# Altium footprint library SCT8-Board.PcbLib: 132 footprints (part 6 of 9)
Each footprint in its own frame and in the unit in brackets; x right, y up, seen from the top. Pads: shape width x height; smd on the part's side, far side on the other; paste and mask are expansions set on the pad; w line width, h text height; cw(c..) or ccw(c..) is an arc to the next point about the centre after c.
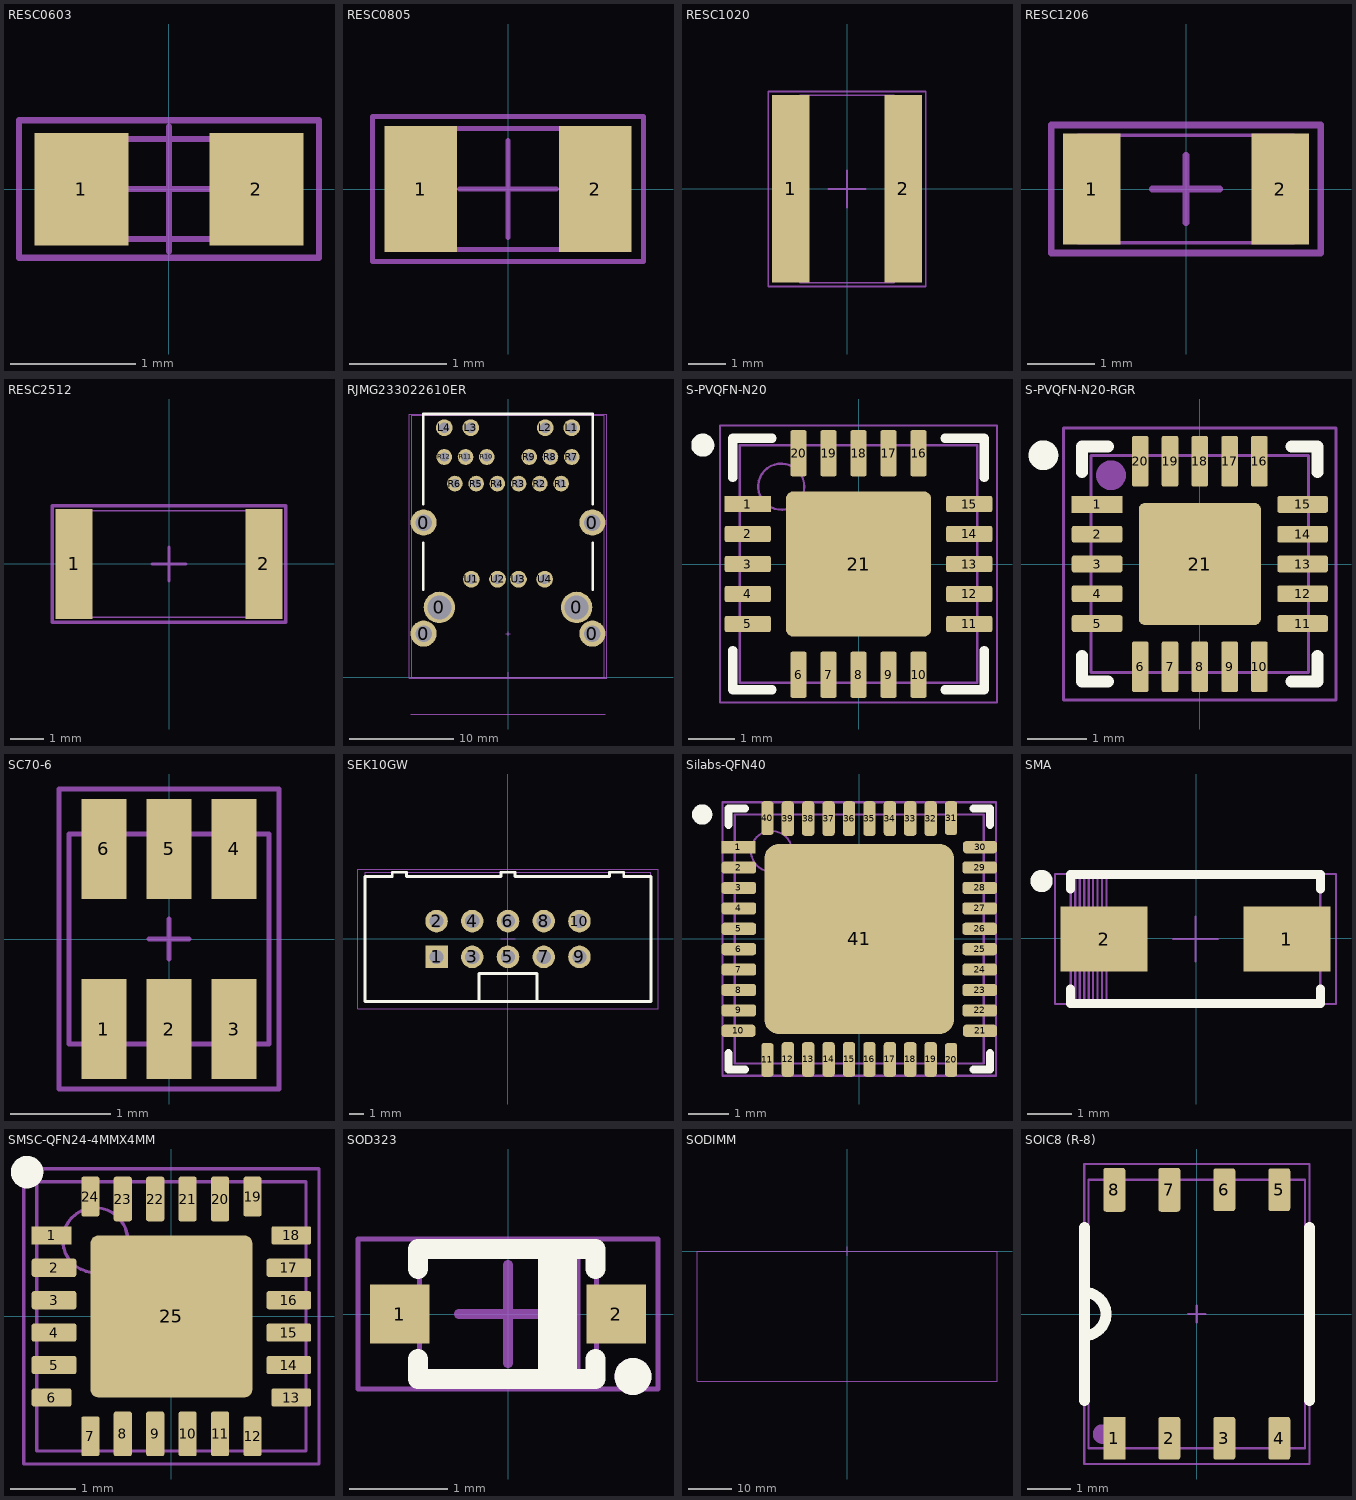
[diagram p5: the footprints below, top view; thin cyan lines are the x and y axes]

## RESC0603 [mm] "Chip Resistor, Body 1.6x0.8mm (LxW typ) [0603], IPC High Density"
height 0.55
pads (2):
  rect 0.75x0.9 smd: 1(-0.7,0) 2(0.7,0)
Top Courtyard:
  lines w0.05: -1.2,-0.55 1.2,-0.55 1.2,0.55 -1.2,0.55 -1.2,-0.55
Top Designator:
  text ".Designator" at -1.126,-0.113 h0.5
Top Component Center:
  lines w0.05: -0.5,0 0.5,0 ; 0,-0.5 0,0.5
Top Component Outline:
  lines w0.05: -0.8,-0.4 -0.8,0.4 0.8,0.4 0.8,-0.4 -0.8,-0.4
3D body "R0603.STEP": height 0.45, standoff 0, extent -0.8,-0.4 0.8,0.4

## RESC0805 [mm] "Chip Resistor, Body 2.0x1.3mm (LxW typ) [0805], IPC High Density"
height 0.6
pads (2):
  rect 0.75x1.3 smd: 1(-0.9,0) 2(0.9,0)
Top Courtyard:
  lines w0.05: -1.4,-0.75 1.4,-0.75 1.4,0.75 -1.4,0.75 -1.4,-0.75
Top Designator:
  text ".Designator" at -1.349,-0.135 h0.6
Top Component Center:
  lines w0.05: -0.5,0 0.5,0 ; 0,-0.5 0,0.5
Top Component Outline:
  lines w0.05: -1,-0.625 -1,0.625 1,0.625 1,-0.625 -1,-0.625
3D body "R0805.STEP": height 0.6, standoff 0, extent -1,-0.625 1,0.625

## RESC1020 [mm] "Chip Resistor, Body 2.5x5.0mm (LxW typ) [1020]"
height 0.65
pads (2):
  rect 1x5 smd: 1(-1.5,0) 2(1.5,0)
Top Courtyard:
  lines w0.05: -2.1,-2.6 2.1,-2.6 2.1,2.6 -2.1,2.6 -2.1,-2.6
Top Designator:
  text ".Designator" at 0.135,-1.349 h0.6
Top Component Center:
  lines w0.05: -0.5,0 0.5,0 ; 0,-0.5 0,0.5
Top Component Outline:
  lines w0.05: -1.25,-2.5 -1.25,2.5 1.25,2.5 1.25,-2.5 -1.25,-2.5
3D body "R1020.STEP": height 0.63, standoff -0.02, extent -1.25,-2.5 1.25,2.5

## RESC1206 [mm] "Chip Resistor, Body 3.2x1.6mm (LxW typ) [1206], IPC High Density"
height 0.65
pads (2):
  rect 0.85x1.65 smd: 1(-1.4,0) 2(1.4,0)
Top Courtyard:
  lines w0.1: -2,-0.95 2,-0.95 2,0.95 -2,0.95 -2,-0.95
Top Designator:
  text ".Designator" at -1.912,-0.192 h0.85
Top Component Center:
  lines w0.1: -0.5,0 0.5,0 ; 0,-0.5 0,0.5
Top Component Outline:
  lines w0.05: -1.6,-0.8 1.6,-0.8 1.6,0.8 -1.6,0.8 -1.6,-0.8
3D body "R1206.STEP": height 0.6, standoff 0, extent -1.6,-0.8 1.6,0.8

## RESC2512 [mm] "Chip Resistor, Body 6.3x3.2mm (LxW typ) [2512], IPC High Density"
height 0.65
pads (2):
  rect 1.1x3.3 smd: 1(-2.85,0) 2(2.85,0)
Top Courtyard:
  lines w0.1: -3.5,-1.75 3.5,-1.75 3.5,1.75 -3.5,1.75 -3.5,-1.75
Top Designator:
  text ".Designator" at -3.378,-0.339 h1.5
Top Component Center:
  lines w0.1: -0.5,0 0.5,0 ; 0,-0.5 0,0.5
Top Component Outline:
  lines w0.05: -3.2,-1.6 -3.2,1.6 3.2,1.6 3.2,-1.6 -3.2,-1.6
3D body "R2512.STEP": height 0.6, standoff 0, extent -3.2,-1.6 3.2,1.6

## RJMG233022610ER [mm] "RJ45 + USB"
pads (26):
  round 2.5 hole 1.57: 0(-8.065,4.18) 0(-8.065,14.8) 0(8.065,4.18) 0(8.065,14.8)
  round 3 hole 2.3: 0(-6.565,6.69) 0(6.565,6.69)
  round 1.6 hole 0.97: L1(6.09,23.87) L2(3.555,23.87) L3(-3.555,23.87) L4(-6.09,23.87) U1(-3.5,9.39) U2(-1,9.39) U3(1,9.39) U4(3.5,9.39)
  round 1.5 hole 0.89: R1(5.075,18.53) R2(3.045,18.53) R3(1.015,18.53) R4(-1.015,18.53) R5(-3.045,18.53) R6(-5.075,18.53) R7(6.09,21.07) R8(4.06,21.07) R9(2.03,21.07) R10(-2.03,21.07) R11(-4.06,21.07) R12(-6.09,21.07)
Top Overlay:
  lines w0.254: -8.1,8.38 -8.1,12.88 ; -8.1,16.58 -8.1,25.18 ; -8.065,25.18 8.1,25.18 8.1,16.58 ; 8.1,8.38 8.1,12.88
Top Solder:
  region: 8.222,5.42 6.893,4.615 6.482,5.192 7.877,5.963
  region: -8.222,5.42 -6.893,4.615 -6.482,5.192 -7.877,5.963
Bottom Solder:
  region: -8.222,5.42 -6.893,4.615 -6.482,5.192 -7.877,5.963
  region: 8.222,5.42 6.893,4.615 6.482,5.192 7.877,5.963
Top Courtyard:
  lines w0.05: -9.45,-0.1 -9.45,25.15 9.45,25.15 9.45,-0.1 -9.45,-0.1
Top Designator:
  text ".Designator" at -10.297,13.984 h2
Top 3D Body:
  lines w0.05: -9.209,0 -9.209,25.07 9.209,25.07 9.209,0 0,0 -9.209,0
Top Component Center:
  lines w0.1: -9.3,-3.5 9.3,-3.5 ; -9.3,0 9.3,0 ; -0.2,4.18 0.2,4.18 ; 0,0 0,0.49 ; 0,3.98 0,4.38
Top Component Outline:
  lines w0.05: -9.45,-0.1 9.45,-0.1 9.45,25.15 -9.45,25.15 -9.45,-0.1
3D body "RJMG233022610ER.STEP": height 23, standoff -3.43, extent -9.209,-45.589 9.209,25.07

## S-PVQFN-N20 [mm] "(RGW) QFN 5mmx5mm, RM 0.65mm"
height 1
pads (21):
  rect 1x0.35 smd: 1(-2.4,1.3)
  rrect25% 1x0.35 smd: 2(-2.4,0.65) 3(-2.4,0) 4(-2.4,-0.65) 5(-2.4,-1.3) 11(2.4,-1.3) 12(2.4,-0.65) 13(2.4,0) 14(2.4,0.65) 15(2.4,1.3)
  rrect25% 0.35x1 smd: 6(-1.3,-2.4) 7(-0.65,-2.4) 8(0,-2.4) 9(0.65,-2.4) 10(1.3,-2.4) 16(1.3,2.4) 17(0.65,2.4) 18(0,2.4) 19(-0.65,2.4) 20(-1.3,2.4)
  rrect10% 3.15x3.15 smd: 21(0,0)
Top Overlay:
  circle w0.25: c-3.375,2.575 r0.125
  lines w0.2: -2.725,-1.875 -2.725,-2.725 -1.875,-2.725 ; -2.725,1.875 -2.725,2.725 -1.875,2.725 ; 1.875,-2.725 2.725,-2.725 2.725,-1.875 ; 1.875,2.725 2.725,2.725 2.725,1.875
Top Courtyard:
  lines w0.05: -3,-3 -3,3 3,3 3,-3 -3,-3
Top Designator:
  text ".Designator" at -1.912,-0.192 h0.85
Top Component Center:
  lines w0.1: -0.5,0 0.5,0 ; 0,-0.5 0,0.5
Top Component Outline:
  circle w0.05: c-1.675,1.675 r0.5
  lines w0.05: -2.575,-2.575 -2.575,2.575 2.575,2.575 2.575,-2.575 -2.575,-2.575
3D body: height 1, standoff 0, extent -2.575,-2.575 2.575,2.575

## S-PVQFN-N20-RGR [mm] "QFN, 20-Leads, Body 3.50x3.50mm, Pitch 0.50mm, Thermal Pad 2.05x2.05mm, IPC High Density"
height 1
pads (21):
  rect 0.85x0.28 smd: 1(-1.725,1)
  rrect25% 0.85x0.28 smd: 2(-1.725,0.5) 3(-1.725,0) 4(-1.725,-0.5) 5(-1.725,-1) 11(1.725,-1) 12(1.725,-0.5) 13(1.725,0) 14(1.725,0.5) 15(1.725,1)
  rrect25% 0.28x0.85 smd: 6(-1,-1.725) 7(-0.5,-1.725) 8(0,-1.725) 9(0.5,-1.725) 10(1,-1.725) 16(1,1.725) 17(0.5,1.725) 18(0,1.725) 19(-0.5,1.725) 20(-1,1.725)
  rrect10% 2.05x2.05 smd: 21(0,0)
Top Overlay:
  circle w0.25: c-2.625,1.825 r0.125
  lines w0.2: -1.975,-1.54 -1.975,-1.975 -1.54,-1.975 ; -1.975,1.54 -1.975,1.975 -1.54,1.975 ; 1.54,-1.975 1.975,-1.975 1.975,-1.54 ; 1.54,1.975 1.975,1.975 1.975,1.54
Top Courtyard:
  lines w0.05: -2.286,-2.286 -2.286,2.286 2.286,2.286 2.286,-2.286 -2.286,-2.286
Top Designator:
  text ".Designator" at -1.689,-0.17 h0.75
Top Component Center:
  lines w0.06: -0.5,0 0.5,0 ; 0,-0.5 0,0.5
Top Component Outline:
  circle w0.3: c-1.49,1.49 r0.1
  lines w0.05: -1.825,-1.825 1.825,-1.825 1.825,1.825 -1.825,1.825 -1.825,-1.825
3D body: height 1, standoff 0, extent -1.825,-1.825 1.825,1.825

## SC70-6 [mm]
pads (6):
  rect 0.45x1 smd paste+0 mask+0.05: 1(-0.65,-0.9) 2(0,-0.9) 3(0.65,-0.9) 4(0.65,0.9) 5(0,0.9) 6(-0.65,0.9)
Top Overlay:
  text "." at -0.65,-1.784 h1
Top Courtyard:
  lines w0.05: -1.1,-1.5 -1.1,1.5 1.1,1.5 1.1,-1.5 -1.1,-1.5
Top Designator:
  text ".Designator" at 0.102,-1.015 h0.45
Top Component Center:
  lines w0.05: -0.2,0 0.2,0 ; 0,-0.2 0,0.2
Top Component Outline:
  lines w0.05: -1,-1.05 -1,1.05 1,1.05 1,-1.05 -1,-1.05
3D body "SC70-6.STEP": height 0.95, standoff 0, extent -1,-1.05 1,1.05

## SEK10GW [mm]
height 9.45
pads (10):
  rect 1.6x1.6 hole 1: 1(-5.08,-1.27)
  round 1.6 hole 1: 2(-5.08,1.27) 3(-2.54,-1.27) 4(-2.54,1.27) 5(0,-1.27) 6(0,1.27) 7(2.54,-1.27) 8(2.54,1.27) 9(5.08,-1.27) 10(5.08,1.27)
Top Overlay:
  lines w0.2: -2.05,-4.45 -2.05,-2.45 2.05,-2.45 2.05,-4.45 ; 1.91,-4.45 10.16,-4.45 ; 2.81,-4.45 4.81,-4.45 ; 10.16,-4.45 10.16,4.45 8.22,4.45 8.22,4.75 7.22,4.75 7.22,4.45 0.5,4.45 0.5,4.75 -0.5,4.75 -0.5,4.45 -7.22,4.45 -7.22,4.75 -8.22,4.75 -8.22,4.45 -10.16,4.45 -10.16,-4.45 10.16,-4.45
Top Courtyard:
  lines w0.05: -10.66,-4.95 -10.66,4.95 10.66,4.95 10.66,-4.95 -10.66,-4.95
Top Designator:
  text ".Designator" at -1.912,-0.192 h0.85
Top 3D Body:
  lines w0.05: -5.395,-1.585 -4.765,-1.585 ; -5.395,-1.585 -4.765,-1.585 ; -5.395,-1.585 -5.395,-0.955 ; -5.395,-1.585 -5.395,-0.955 ; -5.395,-0.955 -4.765,-0.955 ; -5.395,-0.955 -4.765,-0.955 ; -5.395,0.955 -4.765,0.955 ; -5.395,0.955 -4.765,0.955 ; -5.395,0.955 -5.395,1.585 ; -5.395,0.955 -5.395,1.585 ; -5.395,1.585 -4.765,1.585 ; -5.395,1.585 -4.765,1.585 ; -4.765,-1.585 -4.765,-0.955 ; -4.765,-1.585 -4.765,-0.955 ; -4.765,0.955 -4.765,1.585 ; -4.765,0.955 -4.765,1.585 ; -2.855,-1.585 -2.855,-0.955 ; -2.855,-1.585 -2.855,-0.955 ; -2.855,-1.585 -2.225,-1.585 ; -2.855,-1.585 -2.225,-1.585 ; -2.855,-0.955 -2.225,-0.955 ; -2.855,-0.955 -2.225,-0.955 ; -2.855,0.955 -2.855,1.585 ; -2.855,0.955 -2.855,1.585 ; -2.855,0.955 -2.225,0.955 ; -2.855,0.955 -2.225,0.955 ; -2.855,1.585 -2.225,1.585 ; -2.855,1.585 -2.225,1.585 ; -2.225,-1.585 -2.225,-0.955 ; -2.225,-1.585 -2.225,-0.955 ; -2.225,0.955 -2.225,1.585 ; -2.225,0.955 -2.225,1.585 ; -0.315,-1.585 -0.315,-0.955 ; -0.315,-1.585 -0.315,-0.955 ; -0.315,-1.585 0.315,-1.585 ; -0.315,-1.585 0.315,-1.585 ; -0.315,-0.955 0.315,-0.955 ; -0.315,-0.955 0.315,-0.955 ; -0.315,0.955 -0.315,1.585 ; -0.315,0.955 -0.315,1.585 ; -0.315,0.955 0.315,0.955 ; -0.315,0.955 0.315,0.955 ; -0.315,1.585 0.315,1.585 ; -0.315,1.585 0.315,1.585 ; 0.315,-1.585 0.315,-0.955 ; 0.315,-1.585 0.315,-0.955 ; 0.315,0.955 0.315,1.585 ; 0.315,0.955 0.315,1.585 ; 2.225,-1.585 2.855,-1.585 ; 2.225,-1.585 2.855,-1.585 ; 2.225,-1.585 2.225,-0.955 ; 2.225,-1.585 2.225,-0.955 ; 2.225,-0.955 2.855,-0.955 ; 2.225,-0.955 2.855,-0.955 ; 2.225,0.955 2.855,0.955 ; 2.225,0.955 2.855,0.955 ; 2.225,0.955 2.225,1.585 ; 2.225,0.955 2.225,1.585 ; 2.225,1.585 2.855,1.585 ; 2.225,1.585 2.855,1.585 ; 2.855,-1.585 2.855,-0.955 ; 2.855,-1.585 2.855,-0.955 ; 2.855,0.955 2.855,1.585 ; 2.855,0.955 2.855,1.585 ; 4.765,-1.585 4.765,-0.955 ; 4.765,-1.585 4.765,-0.955 ; 4.765,-1.585 5.395,-1.585 ; 4.765,-1.585 5.395,-1.585 ; 4.765,-0.955 5.395,-0.955 ; 4.765,-0.955 5.395,-0.955 ; 4.765,0.955 4.765,1.585 ; 4.765,0.955 4.765,1.585 ; 4.765,0.955 5.395,0.955 ; 4.765,0.955 5.395,0.955 ; 4.765,1.585 5.395,1.585 ; 4.765,1.585 5.395,1.585 ; 5.395,-1.585 5.395,-0.955 ; 5.395,-1.585 5.395,-0.955 ; 5.395,0.955 5.395,1.585 ; 5.395,0.955 5.395,1.585
Top Component Center:
  lines w0.06: -0.5,0 0.5,0 ; 0,-0.5 0,0.5
Top Component Outline:
  lines w0.05: -10.16,-4.45 10.16,-4.45 10.16,4.75 -10.16,4.75 -10.16,-4.45
3D body "09185106324.STEP": height 9.5, standoff -2.85, extent -10.15,-4.45 10.15,4.75

## Silabs-QFN40 [mm] "QFN, 40-Leads, Body 6.00x6.00mm, Pitch 0.50mm, Thermal Pad 4.65x4.65mm, IPC High Density"
height 1.1
pads (41):
  rect 0.83x0.3 smd paste+0 mask+0.05: 1(-2.96,2.25)
  rrect50% 0.85x0.3 smd paste+0 mask+0.05: 2(-2.95,1.75) 3(-2.95,1.25) 4(-2.95,0.75) 5(-2.95,0.25) 6(-2.95,-0.25) 7(-2.95,-0.75) 8(-2.95,-1.25) 9(-2.95,-1.75) 22(2.95,-1.75) 23(2.95,-1.25) 24(2.95,-0.75) 25(2.95,-0.25) 26(2.95,0.25) 27(2.95,0.75) 28(2.95,1.25) 29(2.95,1.75)
  rrect50% 0.83x0.3 smd paste+0 mask+0.05: 10(-2.96,-2.25) 21(2.96,-2.25) 30(2.96,2.25)
  rrect50% 0.3x0.83 smd paste+0 mask+0.05: 11(-2.25,-2.96) 20(2.25,-2.96) 31(2.25,2.96) 40(-2.25,2.96)
  rrect50% 0.3x0.85 smd paste+0 mask+0.05: 12(-1.75,-2.95) 13(-1.25,-2.95) 14(-0.75,-2.95) 15(-0.25,-2.95) 16(0.25,-2.95) 17(0.75,-2.95) 18(1.25,-2.95) 19(1.75,-2.95) 32(1.75,2.95) 33(1.25,2.95) 34(0.75,2.95) 35(0.25,2.95) 36(-0.25,2.95) 37(-0.75,2.95) 38(-1.25,2.95) 39(-1.75,2.95)
  rrect15% 4.65x4.65 smd paste+0 mask+0.05: 41(0,0)
Top Overlay:
  circle w0.25: c-3.85,3.05 r0.125
  lines w0.2: -3.2,-2.8 -3.2,-3.2 -2.8,-3.2 ; -3.2,2.8 -3.2,3.2 -2.8,3.2 ; 2.8,-3.2 3.2,-3.2 3.2,-2.8 ; 2.8,3.2 3.2,3.2 3.2,2.8
Top Courtyard:
  lines w0.05: -3.35,-3.35 3.35,-3.35 3.35,3.35 -3.35,3.35 -3.35,-3.35
Top Designator:
  text ".Designator" at -1.912,-0.192 h0.85
Top Component Center:
  lines w0.05: -0.5,0 0.5,0 ; 0,-0.5 0,0.5
Top Component Outline:
  circle w0.05: c-2.15,2.15 r0.5
  lines w0.05: -3.05,-3.05 3.05,-3.05 3.05,3.05 -3.05,3.05 -3.05,-3.05
3D body: height 1.1, standoff 0, extent -3.05,-3.05 3.05,3.05

## SMA [mm]
pads (2):
  rect 1.95x1.45 smd: 1(2.037,-0.013) 2(-2.063,-0.013)
Top Overlay:
  circle w0.25: c-3.463,1.287 r0.125
  lines w0.2: -2.813,-1.138 -2.813,-1.463 2.787,-1.463 2.787,-1.138 ; -2.813,1.112 -2.813,1.437 2.787,1.437 2.787,1.112
Top Courtyard:
  lines w0.05: -3.163,-1.473 3.137,-1.473 3.137,1.447 -3.163,1.447 -3.163,-1.473
Top Designator:
  text ".Designator" at -1.912,-0.192 h0.85
Top Component Center:
  lines w0.05: -0.513,-0.013 0.487,-0.013 ; -0.013,-0.513 -0.013,0.487
Top Component Outline:
  lines w0.05: -2.708,-1.473 -2.708,1.447 ; -2.608,-1.473 -2.608,1.447 ; -2.508,-1.473 -2.508,1.447 ; -2.408,-1.473 -2.408,1.447 ; -2.308,-1.473 -2.308,1.447 ; -2.208,-1.473 -2.208,1.447 ; -2.108,-1.473 -2.108,1.447 ; -2.008,-1.473 -2.008,1.447 ; -2.808,-1.473 2.782,-1.473 2.782,1.447 -2.808,1.447 -2.808,-1.473
3D body: height 2.4, standoff 0, extent -2.808,-1.473 2.782,1.447

## SMSC-QFN24-4MMX4MM [mm] "QFN, 24-Leads, Body 4.00x4.00mm, Pitch 0.50mm, Thermal Pad 2.50x2.50mm, IPC High Density"
height 1
pads (25):
  rect 0.615x0.28 smd paste+0 mask+0.05: 1(-1.847,1.25)
  rrect25% 0.69x0.28 smd paste+0 mask+0.05: 2(-1.81,0.75) 3(-1.81,0.25) 4(-1.81,-0.25) 5(-1.81,-0.75) 14(1.81,-0.75) 15(1.81,-0.25) 16(1.81,0.25) 17(1.81,0.75)
  rrect25% 0.615x0.28 smd paste+0 mask+0.05: 6(-1.847,-1.25) 13(1.848,-1.25) 18(1.848,1.25)
  rrect25% 0.28x0.615 smd paste+0 mask+0.05: 7(-1.25,-1.848) 12(1.25,-1.848) 19(1.25,1.847) 24(-1.25,1.847)
  rrect25% 0.28x0.69 smd paste+0 mask+0.05: 8(-0.75,-1.81) 9(-0.25,-1.81) 10(0.25,-1.81) 11(0.75,-1.81) 20(0.75,1.81) 21(0.25,1.81) 22(-0.25,1.81) 23(-0.75,1.81)
  rrect10% 2.5x2.5 smd paste+0 mask+0.05: 25(0,0)
Top Overlay:
  circle w0.25: c-2.225,2.225 r0.125
Top Courtyard:
  lines w0.05: -2.275,-2.275 -2.275,2.275 2.275,2.275 2.275,-2.275 -2.275,-2.275
Top Designator:
  text ".Designator" at -1.912,-0.192 h0.85
Top Component Center:
  lines w0.05: -0.5,0 0.5,0 ; 0,-0.5 0,0.5
Top Component Outline:
  circle w0.05: c-1.175,1.175 r0.5
  lines w0.05: -2.075,-2.075 -2.075,2.075 2.075,2.075 2.075,-2.075 -2.075,-2.075
3D body "QFN24_4X4MC_MCH.step": height 1.65, standoff 0, extent -2.07,-2.07 2.07,2.07

## SOD323 [mm]
height 10
pads (2):
  rect 0.6x0.6 smd: 1(-1.1,0) 2(1.1,0)
Top Overlay:
  circle w0.254: c1.27,-0.635 r0.06
  rectangle: 0.305,-0.635 0.7,0.726
  lines w0.2: -0.914,-0.457 -0.914,-0.66 0.889,-0.66 0.889,-0.457 ; -0.914,0.457 -0.914,0.66 0.889,0.66 0.889,0.457
Top Courtyard:
  lines w0.05: -1.524,-0.762 1.524,-0.762 1.524,0.762 -1.524,0.762 -1.524,-0.762
Top Designator:
  text ".Designator" at -0.786,-0.079 h0.35
Top Component Center:
  lines w0.1: -0.5,0 0.5,0 ; 0,-0.5 0,0.5
Top Component Outline:
  circle w0.254: c1.27,-0.635 r0.06
  rectangle: 0.305,-0.686 0.737,0.675
  lines w0.05: -0.9,-0.229 -1.321,-0.229 -1.321,0.229 -0.9,0.229 ; 0.9,-0.229 1.321,-0.229 1.321,0.229 0.9,0.229 ; -0.9,-0.675 -0.9,0.675 0.9,0.675 0.9,-0.675 -0.9,-0.675
3D body: height 1.1, standoff 0, extent -0.9,-0.675 0.9,0.675

## SODIMM [mm] "Generic 260 Pin SODIMM"
Top Component Center:
  lines w0.1: -1,0 1,0 ; 0,-1 0,1
Bottom 3D Body:
  lines w0.254: -34.893,-30.19 -34.893,0 34.893,0 34.893,-30.19 -34.893,-30.19
3D body "260PinSODIMM.STEP": height 7.43, standoff 4.93, extent -34.8,-30.094 34.8,-0.094

## SOIC8 (R-8) [mil]
pads (8):
  rect 20x39 smd: 1(-75,-113)
  rrect25% 20x39 smd: 2(-25,-113) 3(25,-113) 4(75,-113) 5(75,113) 6(25,113)
  rrect25% 20x40 smd: 7(-25,113) 8(-75,113)
Top Overlay:
  lines w10: -102.36,-78.74 -102.36,78.74 ; -102.36,-19.68 ccw(c-102.36,0) -102.36,19.68 ; 102.36,-78.74 102.36,78.74
Top Courtyard:
  lines w1.97: -102.36,-136.44 -102.36,136.44 102.36,136.44 102.36,-136.44 -102.36,-136.44
Top Designator:
  text ".Designator" at 3.11,-30.94 h13.78
Top Component Center:
  lines w1.97: -7.87,0 7.87,0 ; 0,-7.87 0,7.87
Top Component Outline:
  circle w10: c-85.63,-109.25 r3.94
  lines w1.97: -98.42,-122.04 -98.42,122.05 98.43,122.05 98.43,-122.04 -98.42,-122.04
3D body "SOIC8N.step": height 68.9, standoff 0, extent -98.42,-122.04 98.43,122.05